# Altium footprint library CONNECTOR.PcbLib: 169 footprints (part 4 of 11)
Each footprint in its own frame and in the unit in brackets; x right, y up, seen from the top. Pads: shape width x height; smd on the part's side, far side on the other; paste and mask are expansions set on the pad; w line width, h text height; cw(c..) or ccw(c..) is an arc to the next point about the centre after c.
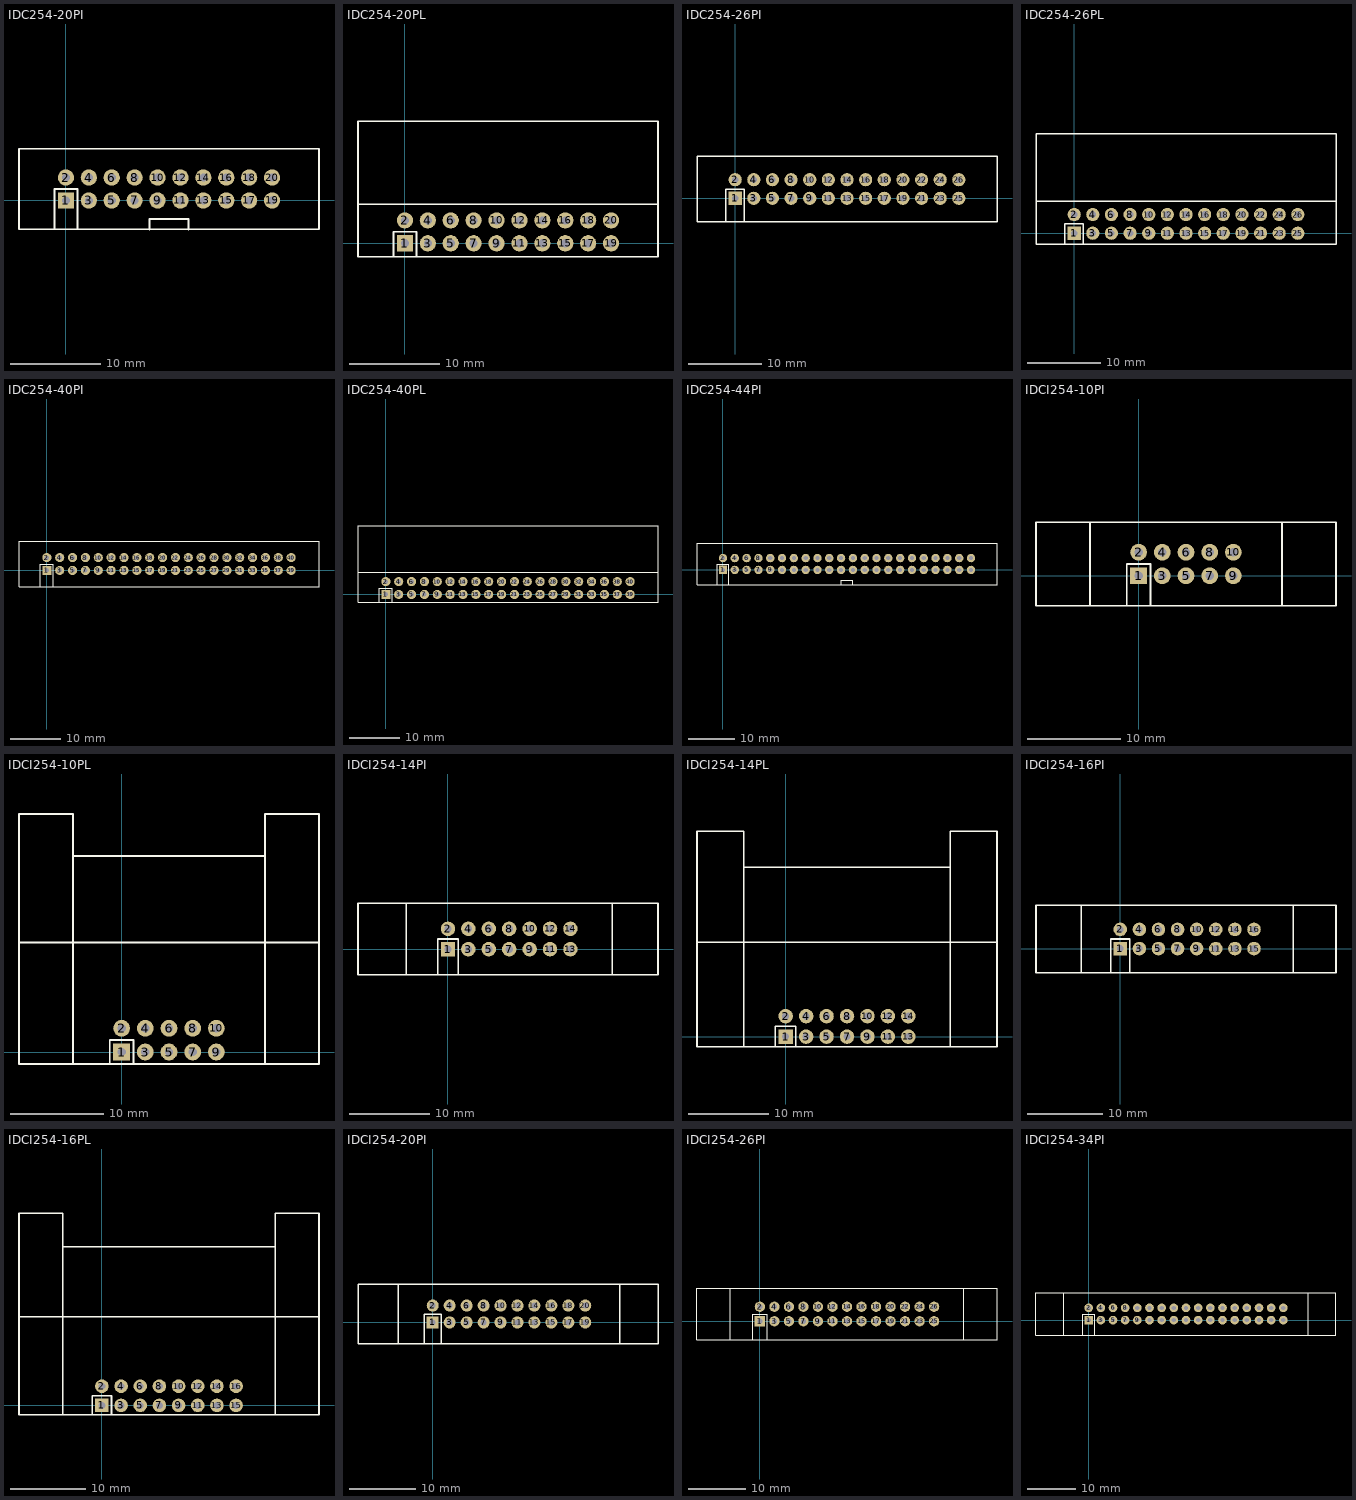
[diagram p3: the footprints below, top view; thin cyan lines are the x and y axes]

## IDC254-20PI [mm]
pads (20):
  rect 1.8x1.8 hole 0.9: 1(0,0)
  round 1.8 hole 0.9: 2(0,2.54) 3(2.54,0) 4(2.54,2.54) 5(5.08,0) 6(5.08,2.54) 7(7.62,0) 8(7.62,2.54) 9(10.16,0) 10(10.16,2.54) 11(12.7,0) 12(12.7,2.54) 13(15.24,0) 14(15.24,2.54) 15(17.78,0) 16(17.78,2.54) 17(20.32,0) 18(20.32,2.54) 19(22.86,0) 20(22.86,2.54)
Top Overlay:
  lines w0.2: -1.27,-3.2 -1.27,1.27 1.27,1.27 1.27,-3.2 ; -5.2,-3.2 -5.2,5.74 28.06,5.74 28.06,-3.2 -5.2,-3.2
  lines w0.254: 9.278,-3.192 9.278,-2.065 13.601,-2.065 13.601,-3.178
3D body "1437045-2.stp": height 9, standoff -2.81, extent -5.097,-3.205 27.923,6.015

## IDC254-20PL [mm]
pads (20):
  rect 1.8x1.8 hole 0.9: 1(0,0)
  round 1.8 hole 0.9: 2(0,2.54) 3(2.54,0) 4(2.54,2.54) 5(5.08,0) 6(5.08,2.54) 7(7.62,0) 8(7.62,2.54) 9(10.16,0) 10(10.16,2.54) 11(12.7,0) 12(12.7,2.54) 13(15.24,0) 14(15.24,2.54) 15(17.78,0) 16(17.78,2.54) 17(20.32,0) 18(20.32,2.54) 19(22.86,0) 20(22.86,2.54)
Top Overlay:
  lines w0.2: -5.2,4.34 28.06,4.34 ; -1.27,-1.5 -1.27,1.27 1.27,1.27 1.27,-1.5 ; -5.2,-1.5 28.06,-1.5 28.06,13.54 -5.2,13.54 -5.2,-1.5
3D body "9-1437044-5.stp": height 9.45, standoff -2.37, extent -5.085,-0.443 27.935,12.143

## IDC254-26PI [mm]
pads (26):
  rect 1.8x1.8 hole 0.9: 1(0,0.002)
  round 1.8 hole 0.9: 2(0,2.542) 3(2.54,0.002) 4(2.54,2.542) 5(5.08,0.002) 6(5.08,2.542) 7(7.62,0.002) 8(7.62,2.542) 9(10.16,0.002) 10(10.16,2.542) 11(12.7,0.002) 12(12.7,2.542) 13(15.24,0.002) 14(15.24,2.542) 15(17.78,0.002) 16(17.78,2.542) 17(20.32,0.002) 18(20.32,2.542) 19(22.86,0.002) 20(22.86,2.542) 21(25.4,0.002) 22(25.4,2.542) 23(27.94,0.002) 24(27.94,2.542) 25(30.48,0.002) 26(30.48,2.542)
Top Overlay:
  lines w0.2: -1.27,-3.198 -1.27,1.272 1.27,1.272 1.27,-3.198 ; -5.2,-3.198 -5.2,5.742 35.68,5.742 35.68,-3.198 -5.2,-3.198
3D body "3-1437045-2.stp": height 9, standoff -2.81, extent -5.229,-3.438 35.411,5.781

## IDC254-26PL [mm]
pads (26):
  rect 1.8x1.8 hole 0.9: 1(0,0)
  round 1.8 hole 0.9: 2(0,2.54) 3(2.54,0) 4(2.54,2.54) 5(5.08,0) 6(5.08,2.54) 7(7.62,0) 8(7.62,2.54) 9(10.16,0) 10(10.16,2.54) 11(12.7,0) 12(12.7,2.54) 13(15.24,0) 14(15.24,2.54) 15(17.78,0) 16(17.78,2.54) 17(20.32,0) 18(20.32,2.54) 19(22.86,0) 20(22.86,2.54) 21(25.4,0) 22(25.4,2.54) 23(27.94,0) 24(27.94,2.54) 25(30.48,0) 26(30.48,2.54)
Top Overlay:
  lines w0.2: -5.2,4.34 35.68,4.34 ; -1.27,-1.5 -1.27,1.27 1.27,1.27 1.27,-1.5 ; -5.2,-1.5 35.68,-1.5 35.68,13.54 -5.2,13.54 -5.2,-1.5
3D body "2-1437045-5.stp": height 9.45, standoff -2.37, extent -5.199,-0.312 35.441,12.274

## IDC254-40PI [mm]
pads (40):
  rect 1.8x1.8 hole 0.9: 1(0,0)
  round 1.8 hole 0.9: 2(0,2.54) 3(2.54,0) 4(2.54,2.54) 5(5.08,0) 6(5.08,2.54) 7(7.62,0) 8(7.62,2.54) 9(10.16,0) 10(10.16,2.54) 11(12.7,0) 12(12.7,2.54) 13(15.24,0) 14(15.24,2.54) 15(17.78,0) 16(17.78,2.54) 17(20.32,0) 18(20.32,2.54) 19(22.86,0) 20(22.86,2.54) 21(25.4,0) 22(25.4,2.54) 23(27.94,0) 24(27.94,2.54) 25(30.48,0) 26(30.48,2.54) 27(33.02,0) 28(33.02,2.54) 29(35.56,0) 30(35.56,2.54) 31(38.1,0) 32(38.1,2.54) 33(40.64,0) 34(40.64,2.54) 35(43.18,0) 36(43.18,2.54) 37(45.72,0) 38(45.72,2.54) 39(48.26,0) 40(48.26,2.54)
Top Overlay:
  lines w0.2: -1.27,-3.2 -1.27,1.27 1.27,1.27 1.27,-3.2 ; -5.5,-3.2 53.76,-3.2 53.76,5.74 -5.5,5.74 -5.5,-3.2
3D body "8-1437045-3.stp": height 9, standoff -2.81, extent -5.088,-3.159 53.332,6.06

## IDC254-40PL [mm]
pads (40):
  rect 1.8x1.8 hole 0.9: 1(0,0)
  round 1.8 hole 0.9: 2(0,2.54) 3(2.54,0) 4(2.54,2.54) 5(5.08,0) 6(5.08,2.54) 7(7.62,0) 8(7.62,2.54) 9(10.16,0) 10(10.16,2.54) 11(12.7,0) 12(12.7,2.54) 13(15.24,0) 14(15.24,2.54) 15(17.78,0) 16(17.78,2.54) 17(20.32,0) 18(20.32,2.54) 19(22.86,0) 20(22.86,2.54) 21(25.4,0) 22(25.4,2.54) 23(27.94,0) 24(27.94,2.54) 25(30.48,0) 26(30.48,2.54) 27(33.02,0) 28(33.02,2.54) 29(35.56,0) 30(35.56,2.54) 31(38.1,0) 32(38.1,2.54) 33(40.64,0) 34(40.64,2.54) 35(43.18,0) 36(43.18,2.54) 37(45.72,0) 38(45.72,2.54) 39(48.26,0) 40(48.26,2.54)
Top Overlay:
  lines w0.2: -5.5,-1.5 -5.5,13.54 ; -5.5,-1.499 53.76,-1.499 ; -5.5,4.343 53.76,4.343 ; -5.5,13.538 53.76,13.538 53.76,-1.502 ; -1.27,-1.5 -1.27,1.27 1.27,1.27 1.27,-1.5
3D body "User Library-IDC Socket Male 40pin Angled THT Goldplated 2_54mm.STEP": height 8.98, standoff -2.37, extent -5.397,-0.313 53.643,13.247

## IDC254-44PI [mm]
pads (44):
  rect 1.8x1.8 hole 0.9: 1(0,0)
  round 1.8 hole 0.9: 2(0,2.54) 3(2.54,0) 4(2.54,2.54) 5(5.08,0) 6(5.08,2.54) 7(7.62,0) 8(7.62,2.54) 9(10.16,0) 10(10.16,2.54) 11(12.7,0) 12(12.7,2.54) 13(15.24,0) 14(15.24,2.54) 15(17.78,0) 16(17.78,2.54) 17(20.32,0) 18(20.32,2.54) 19(22.86,0) 20(22.86,2.54) 21(25.4,0) 22(25.4,2.54) 23(27.94,0) 24(27.94,2.54) 25(30.48,0) 26(30.48,2.54) 27(33.02,0) 28(33.02,2.54) 29(35.56,0) 30(35.56,2.54) 31(38.1,0) 32(38.1,2.54) 33(40.64,0) 34(40.64,2.54) 35(43.18,0) 36(43.18,2.54) 37(45.72,0) 38(45.72,2.54) 39(48.26,0) 40(48.26,2.54) 41(50.8,0) 42(50.8,2.54) 43(53.34,0) 44(53.34,2.54)
Top Overlay:
  lines w0.2: -1.27,-3.2 -1.27,1.27 1.27,1.27 1.27,-3.2 ; -5.588,-3.2 58.928,-3.2 58.928,5.74 -5.588,5.74 -5.588,-3.2
  lines w0.254: 25.4,-3.15 25.4,-2.25 27.94,-2.25 27.94,-3.165

## IDCI254-10PI [mm]
pads (10):
  rect 1.8x1.8 hole 0.9: 1(0,0)
  round 1.8 hole 0.9: 2(0,2.54) 3(2.54,0) 4(2.54,2.54) 5(5.08,0) 6(5.08,2.54) 7(7.62,0) 8(7.62,2.54) 9(10.16,0) 10(10.16,2.54)
Top Overlay:
  lines w0.2: -5.2,-3.2 -5.2,5.739 ; -1.275,-3.2 -1.275,1.275 1.265,1.275 ; 1.27,-3.2 1.27,1.27 ; 15.36,-3.2 15.36,5.739 ; -11,-3.2 -11,5.739 21.16,5.739 21.16,-3.2 -11,-3.2
3D body "1761685-3.stp": height 17.22, standoff -2.59, extent -10.775,-3.174 20.975,6.045

## IDCI254-10PL [mm]
height 8.54
pads (10):
  rect 1.8x1.8 hole 0.9: 1(0,0)
  round 1.8 hole 0.9: 2(0,2.54) 3(2.54,0) 4(2.54,2.54) 5(5.08,0) 6(5.08,2.54) 7(7.62,0) 8(7.62,2.54) 9(10.16,0) 10(10.16,2.54)
Top Overlay:
  lines w0.2: -11,11.73 21.16,11.73 ; -5.2,-1.27 -5.2,25.5 -11,25.5 -11,-1.27 21.16,-1.27 21.16,25.5 15.36,25.5 15.36,-1.27 15.36,5.74 ; -5.2,21 15.36,21 ; -1.275,-1.265 -1.275,1.275 1.265,1.275 1.265,-1.265
3D body "1761685-3.stp": height 17.22, standoff -2.59, extent -10.775,-3.174 20.975,6.045

## IDCI254-14PI [mm]
pads (14):
  rect 1.8x1.8 hole 0.9: 1(0.001,-0.001)
  round 1.8 hole 0.9: 2(0.001,2.539) 3(2.541,-0.001) 4(2.541,2.539) 5(5.081,-0.001) 6(5.081,2.539) 7(7.621,-0.001) 8(7.621,2.539) 9(10.161,-0.001) 10(10.161,2.539) 11(12.701,-0.001) 12(12.701,2.539) 13(15.241,-0.001) 14(15.241,2.539)
Top Overlay:
  lines w0.2: -5.199,-3.201 -5.199,5.739 ; -1.269,-3.201 -1.269,1.269 1.271,1.269 1.271,-3.201 ; 20.441,-3.201 20.441,5.739 ; -11.199,-3.201 -11.199,5.739 26.141,5.739 26.141,-3.201 -11.199,-3.201
3D body "14406.stp": height 23.2, standoff -3.3, extent -10.908,-2.695 26.072,5.605

## IDCI254-14PL [mm]
height 8.54
pads (14):
  rect 1.8x1.8 hole 0.9: 1(0,0)
  round 1.8 hole 0.9: 2(0,2.54) 3(2.54,0) 4(2.54,2.54) 5(5.08,0) 6(5.08,2.54) 7(7.62,0) 8(7.62,2.54) 9(10.16,0) 10(10.16,2.54) 11(12.7,0) 12(12.7,2.54) 13(15.24,0) 14(15.24,2.54)
Top Overlay:
  lines w0.2: -11,11.73 26.233,11.73 ; -5.2,-1.27 -5.2,25.5 -11,25.5 -11,-1.27 26.24,-1.27 26.24,25.5 20.44,25.5 20.44,-1.27 ; -5.2,21 20.44,21 ; -1.275,-1.265 -1.275,1.275 1.265,1.275 1.265,-1.265
3D body "1761685-3.stp": height 17.22, standoff -2.59, extent -10.775,-3.174 20.975,6.045

## IDCI254-16PI [mm]
pads (16):
  rect 1.8x1.8 hole 0.9: 1(-0.002,-0.001)
  round 1.8 hole 0.9: 2(-0.002,2.539) 3(2.538,-0.001) 4(2.538,2.539) 5(5.078,-0.001) 6(5.078,2.539) 7(7.618,-0.001) 8(7.618,2.539) 9(10.158,-0.001) 10(10.158,2.539) 11(12.698,-0.001) 12(12.698,2.539) 13(15.238,-0.001) 14(15.238,2.539) 15(17.778,-0.001) 16(17.778,2.539)
Top Overlay:
  lines w0.2: -5.202,-3.2 -5.202,5.739 ; -1.272,-3.2 -1.272,1.269 1.268,1.269 1.268,-3.2 ; 22.978,-3.2 22.978,5.739 ; -11.202,-3.2 -11.202,5.739 28.678,5.739 28.678,-3.2 -11.202,-3.2
3D body "14409.stp": height 23.2, standoff -3.3, extent -10.869,-2.661 28.65,5.639

## IDCI254-16PL [mm]
pads (16):
  rect 1.8x1.8 hole 0.9: 1(0,0)
  round 1.8 hole 0.9: 2(0,2.54) 3(2.54,0) 4(2.54,2.54) 5(5.08,0) 6(5.08,2.54) 7(7.62,0) 8(7.62,2.54) 9(10.16,0) 10(10.16,2.54) 11(12.7,0) 12(12.7,2.54) 13(15.24,0) 14(15.24,2.54) 15(17.78,0) 16(17.78,2.54)
Top Overlay:
  lines w0.2: -11,11.73 28.78,11.73 ; -5.2,-1.27 -5.2,25.5 -11,25.5 -11,-1.27 28.78,-1.27 28.78,25.5 22.98,25.5 22.98,-1.27 ; -5.2,21 22.98,21 ; -1.275,-1.265 -1.275,1.275 1.265,1.275 1.265,-1.265
3D body "1761685-3.stp": height 17.22, standoff -2.59, extent -10.775,-3.174 20.975,6.045

## IDCI254-20PI [mm]
pads (20):
  rect 1.8x1.8 hole 0.9: 1(0,0)
  round 1.8 hole 0.9: 2(0,2.54) 3(2.54,0) 4(2.54,2.54) 5(5.08,0) 6(5.08,2.54) 7(7.62,0) 8(7.62,2.54) 9(10.16,0) 10(10.16,2.54) 11(12.7,0) 12(12.7,2.54) 13(15.24,0) 14(15.24,2.54) 15(17.78,0) 16(17.78,2.54) 17(20.32,0) 18(20.32,2.54) 19(22.86,0) 20(22.86,2.54)
Top Overlay:
  lines w0.2: -5.2,-3.2 -5.2,5.74 ; -1.27,-3.2 -1.27,1.27 1.27,1.27 1.27,-3.2 ; 28.06,-3.2 28.06,5.74 ; -11.2,-3.2 -11.2,5.74 33.76,5.74 33.76,-3.2 -11.2,-3.2
3D body "14412.stp": height 23.2, standoff -3.3, extent -10.841,-2.663 33.759,5.637

## IDCI254-26PI [mm]
pads (26):
  rect 1.8x1.8 hole 0.9: 1(0,0)
  round 1.8 hole 0.9: 2(0,2.54) 3(2.54,0) 4(2.54,2.54) 5(5.08,0) 6(5.08,2.54) 7(7.62,0) 8(7.62,2.54) 9(10.16,0) 10(10.16,2.54) 11(12.7,0) 12(12.7,2.54) 13(15.24,0) 14(15.24,2.54) 15(17.78,0) 16(17.78,2.54) 17(20.32,0) 18(20.32,2.54) 19(22.86,0) 20(22.86,2.54) 21(25.4,0) 22(25.4,2.54) 23(27.94,0) 24(27.94,2.54) 25(30.48,0) 26(30.48,2.54)
Top Overlay:
  lines w0.2: -5.2,-3.2 -5.2,5.74 ; -1.27,-3.2 -1.27,1.27 1.27,1.27 1.27,-3.2 ; 35.68,-3.2 35.68,5.74 ; -11,-3.2 -11,5.74 41.48,5.74 41.48,-3.2 -11,-3.2
3D body "User Library-IDC connector 26-pin straight M.STEP": height 24.89, standoff -1.61, extent -11.076,-2.991 41.524,5.509

## IDCI254-34PI [mm]
pads (34):
  rect 1.8x1.8 hole 0.9: 1(0,0)
  round 1.8 hole 0.9: 2(0,2.54) 3(2.54,0) 4(2.54,2.54) 5(5.08,0) 6(5.08,2.54) 7(7.62,0) 8(7.62,2.54) 9(10.16,0) 10(10.16,2.54) 11(12.7,0) 12(12.7,2.54) 13(15.24,0) 14(15.24,2.54) 15(17.78,0) 16(17.78,2.54) 17(20.32,0) 18(20.32,2.54) 19(22.86,0) 20(22.86,2.54) 21(25.4,0) 22(25.4,2.54) 23(27.94,0) 24(27.94,2.54) 25(30.48,0) 26(30.48,2.54) 27(33.02,0) 28(33.02,2.54) 29(35.56,0) 30(35.56,2.54) 31(38.1,0) 32(38.1,2.54) 33(40.64,0) 34(40.64,2.54)
Top Overlay:
  lines w0.2: -5.2,-3.2 -5.2,5.74 ; -1.27,-3.2 -1.27,1.27 1.27,1.27 1.27,-3.2 ; 45.84,-3.2 45.84,5.74 ; -11,-3.2 -11,5.74 51.64,5.74 51.64,-3.2 -11,-3.2